# Altium footprint library Wurth_Elektronik_Electromechanic_Wire_to_Board_Connectors_rev16a.PCBLIB: 662 footprints (part 32 of 42)
Each footprint in its own frame and in the unit in brackets; x right, y up, seen from the top. Pads: shape width x height; smd on the part's side, far side on the other; paste and mask are expansions set on the pad; w line width, h text height; cw(c..) or ccw(c..) is an arc to the next point about the centre after c.
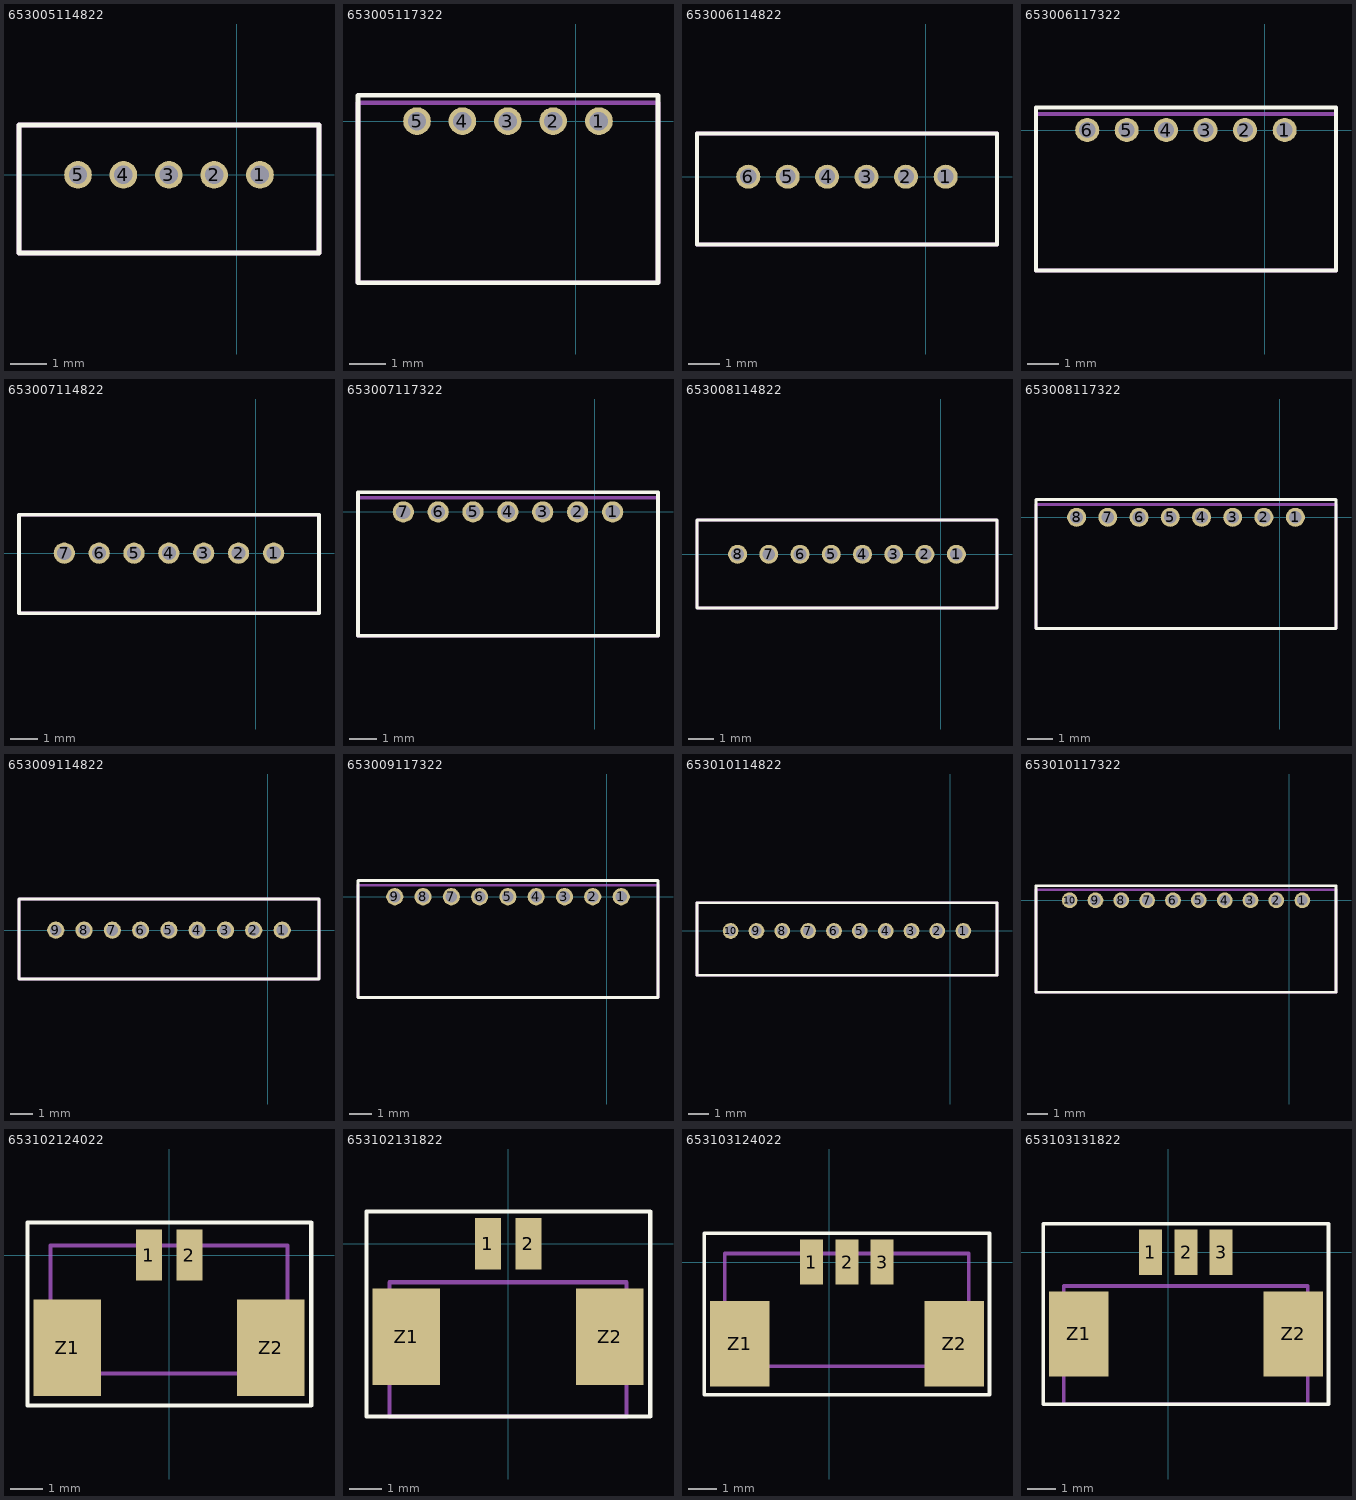
[diagram p31: the footprints below, top view; thin cyan lines are the x and y axes]

## 653005114822 [mil]
pads (5):
  round 30 hole 20: 1(25,0) 2(-24.61,0) 3(-73.82,0) 4(-123.03,0) 5(-172.24,0)
Top Overlay:
  lines w5: -236.22,-84.65 89,-84.65 89,54 -236.22,54 -236.22,-84.65
Mechanical 2:
  text ">NAME" at 153,-4.92 h77.5
Mechanical 4:
  text ">VALUE" at 153,-63.98 h77.5
Mechanical 16:
  lines w5: -236.22,-84.65 89,-84.65 89,54 -236.22,54 -236.22,-84.65
  text "1" at 13,-12.3 h49.6
  text "5" at -184.55,-12.3 h49.6

## 653005117322 [mil]
pads (5):
  round 30 hole 20: 1(25,0) 2(-24.61,0) 3(-73.82,0) 4(-123.03,0) 5(-172.24,0)
Top Overlay:
  lines w5: -236.22,-175.2 89,-175.2 89,28 -236.22,28 -236.22,-175.2
Mechanical 2:
  text ">NAME" at 153,-4.92 h77.5
Mechanical 4:
  text ">VALUE" at 153,-63.98 h77.5
Mechanical 16:
  lines w5: -236.22,-175.2 89,-175.2 89,20 -236.22,20 -236.22,-175.2
  text "1" at 13,-12.3 h49.6
  text "5" at -184.55,-12.3 h49.6

## 653006114822 [mil]
pads (6):
  round 30 hole 20: 1(25,0) 2(-24.61,0) 3(-73.82,0) 4(-123.03,0) 5(-172.24,0) 6(-221.46,0)
Top Overlay:
  lines w5: -285.43,-84.65 89,-84.65 89,54 -285.43,54 -285.43,-84.65
Mechanical 2:
  text ">NAME" at 153,-4.92 h77.5
Mechanical 4:
  text ">VALUE" at 153,-63.98 h77.5
Mechanical 16:
  lines w5: -285.43,-84.65 89,-84.65 89,54 -285.43,54 -285.43,-84.65
  text "1" at 13,-12.3 h49.6
  text "6" at -233.76,-12.3 h49.6

## 653006117322 [mil]
pads (6):
  round 30 hole 20: 1(25,0) 2(-24.61,0) 3(-73.82,0) 4(-123.03,0) 5(-172.24,0) 6(-221.46,0)
Top Overlay:
  lines w5: -285.43,-175.2 89,-175.2 89,28 -285.43,28 -285.43,-175.2
Mechanical 2:
  text ">NAME" at 153,-4.92 h77.5
Mechanical 4:
  text ">VALUE" at 153,-63.98 h77.5
Mechanical 16:
  lines w5: -285.43,-175.2 89,-175.2 89,20 -285.43,20 -285.43,-175.2
  text "1" at 13,-12.3 h49.6
  text "6" at -233.76,-12.3 h49.6

## 653007114822 [mil]
pads (7):
  round 30 hole 20: 1(25,0) 2(-24.61,0) 3(-73.82,0) 4(-123.03,0) 5(-172.24,0) 6(-221.46,0) 7(-270.67,0)
Top Overlay:
  lines w5: -334.65,-84.65 89,-84.65 89,54 -334.65,54 -334.65,-84.65
Mechanical 2:
  text ">NAME" at 153,-4.92 h77.5
Mechanical 4:
  text ">VALUE" at 153,-63.98 h77.5
Mechanical 16:
  lines w5: -334.65,-84.65 89,-84.65 89,54 -334.65,54 -334.65,-84.65
  text "1" at 13,-12.3 h49.6
  text "7" at -282.97,-12.3 h49.6

## 653007117322 [mil]
pads (7):
  round 30 hole 20: 1(25,0) 2(-24.61,0) 3(-73.82,0) 4(-123.03,0) 5(-172.24,0) 6(-221.46,0) 7(-270.67,0)
Top Overlay:
  lines w5: -334.65,-175.2 89,-175.2 89,28 -334.65,28 -334.65,-175.2
Mechanical 2:
  text ">NAME" at 153,-4.92 h77.5
Mechanical 4:
  text ">VALUE" at 153,-63.98 h77.5
Mechanical 16:
  lines w5: -334.65,-175.2 89,-175.2 89,20 -334.65,20 -334.65,-175.2
  text "1" at 13,-12.3 h49.6
  text "7" at -282.97,-12.3 h49.6

## 653008114822 [mil]
pads (8):
  round 30 hole 20: 1(25,0) 2(-24.61,0) 3(-73.82,0) 4(-123.03,0) 5(-172.24,0) 6(-221.46,0) 7(-270.67,0) 8(-319.88,0)
Top Overlay:
  lines w5: -383.86,-84.65 89,-84.65 89,54 -383.86,54 -383.86,-84.65
Mechanical 2:
  text ">NAME" at 153,-4.92 h77.5
Mechanical 4:
  text ">VALUE" at 153,-63.98 h77.5
Mechanical 16:
  lines w5: -383.86,-84.65 89,-84.65 89,54 -383.86,54 -383.86,-84.65
  text "1" at 13,-12.3 h49.6
  text "8" at -332.19,-12.3 h49.6

## 653008117322 [mil]
pads (8):
  round 30 hole 20: 1(25,0) 2(-24.61,0) 3(-73.82,0) 4(-123.03,0) 5(-172.24,0) 6(-221.46,0) 7(-270.67,0) 8(-319.88,0)
Top Overlay:
  lines w5: -383.86,-175.2 89,-175.2 89,28 -383.86,28 -383.86,-175.2
Mechanical 2:
  text ">NAME" at 153,-4.92 h77.5
Mechanical 4:
  text ">VALUE" at 153,-63.98 h77.5
Mechanical 16:
  lines w5: -383.86,-175.2 89,-175.2 89,20 -383.86,20 -383.86,-175.2
  text "1" at 13,-12.3 h49.6
  text "8" at -332.19,-12.3 h49.6

## 653009114822 [mil]
pads (9):
  round 30 hole 20: 1(25,0) 2(-24.61,0) 3(-73.82,0) 4(-123.03,0) 5(-172.24,0) 6(-221.46,0) 7(-270.67,0) 8(-319.88,0) 9(-369.09,0)
Top Overlay:
  lines w5: -433.07,-84.65 89,-84.65 89,54 -433.07,54 -433.07,-84.65
Mechanical 2:
  text ">NAME" at 153,-4.92 h77.5
Mechanical 4:
  text ">VALUE" at 153,-63.98 h77.5
Mechanical 16:
  lines w5: -433.07,-84.65 89,-84.65 89,54 -433.07,54 -433.07,-84.65
  text "1" at 13,-12.3 h49.6
  text "9" at -381.4,-12.3 h49.6

## 653009117322 [mil]
pads (9):
  round 30 hole 20: 1(25,0) 2(-24.61,0) 3(-73.82,0) 4(-123.03,0) 5(-172.24,0) 6(-221.46,0) 7(-270.67,0) 8(-319.88,0) 9(-369.09,0)
Top Overlay:
  lines w5: -433.07,-175.2 89,-175.2 89,28 -433.07,28 -433.07,-175.2
Mechanical 2:
  text ">NAME" at 153,-4.92 h77.5
Mechanical 4:
  text ">VALUE" at 153,-63.98 h77.5
Mechanical 16:
  lines w5: -433.07,-175.2 89,-175.2 89,20 -433.07,20 -433.07,-175.2
  text "1" at 13,-12.3 h49.6
  text "9" at -381.4,-12.3 h49.6

## 653010114822 [mil]
pads (10):
  round 30 hole 20: 1(25,0) 2(-24.61,0) 3(-73.82,0) 4(-123.03,0) 5(-172.24,0) 6(-221.46,0) 7(-270.67,0) 8(-319.88,0) 9(-369.09,0) 10(-418.31,0)
Top Overlay:
  lines w5: -482.28,-84.65 89,-84.65 89,54 -482.28,54 -482.28,-84.65
Mechanical 2:
  text ">NAME" at 153,-4.92 h77.5
Mechanical 4:
  text ">VALUE" at 153,-63.98 h77.5
Mechanical 16:
  lines w5: -482.28,-84.65 89,-84.65 89,54 -482.28,54 -482.28,-84.65
  text "1" at 13,-12.3 h49.6
  text "10" at -442.91,-12.3 h49.6

## 653010117322 [mil]
pads (10):
  round 30 hole 20: 1(25,0) 2(-24.61,0) 3(-73.82,0) 4(-123.03,0) 5(-172.24,0) 6(-221.46,0) 7(-270.67,0) 8(-319.88,0) 9(-369.09,0) 10(-418.31,0)
Top Overlay:
  lines w5: -482.28,-175.2 89,-175.2 89,28 -482.28,28 -482.28,-175.2
Mechanical 2:
  text ">NAME" at 153,-4.92 h77.5
Mechanical 4:
  text ">VALUE" at 153,-63.98 h77.5
Mechanical 16:
  lines w5: -482.28,-175.2 89,-175.2 89,20 -482.28,20 -482.28,-175.2
  text "1" at 13,-12.3 h49.6
  text "10" at -455.22,-12.3 h49.6

## 653102124022 [mil]
pads (4):
  rect 32x63 smd: 1(-24.61,0) 2(25,0)
  rect 83x119 smd: Z1(-125,-114.17) Z2(125,-114.17)
Top Overlay:
  lines w5: -174.21,-185.04 175,-185.04 175,40 -174.21,40 -174.21,-185.04
Mechanical 2:
  text ">NAME" at -120.47,54 h77.5
Mechanical 4:
  text ">VALUE" at -144.98,-251.48 h77.5
Mechanical 16:
  lines w5: -145.67,-145.67 146,-145.67 146,12 -145.67,12 -145.67,-145.67
  text "1" at -50,-50 h77.5

## 653102131822 [mil]
pads (4):
  rect 32x63 smd: 1(-24.61,0) 2(25,0)
  rect 83x119 smd: Z1(-125,-114.17) Z2(125,-114.17)
Top Overlay:
  lines w5: -174.21,-212.6 175,-212.6 175,40 -174.21,40 -174.21,-212.6
Mechanical 2:
  text ">NAME" at -120.47,54 h77.5
Mechanical 4:
  text ">VALUE" at -119.98,-276.48 h77.5
Mechanical 16:
  lines w5: -145.67,-212.6 146,-212.6 146,-47.24 -145.67,-47.24 -145.67,-212.6
  text "1" at -50,-25 h77.5

## 653103124022 [mil]
pads (5):
  rect 32x63 smd: 1(-24.61,0) 2(25,0) 3(74,0)
  rect 83x119 smd: Z1(-125,-114.17) Z2(175,-114.17)
Top Overlay:
  lines w5: -174.21,-185.04 224,-185.04 224,40 -174.21,40 -174.21,-185.04
Mechanical 2:
  text ">NAME" at -95.47,54 h77.5
Mechanical 4:
  text ">VALUE" at -94.98,-251.48 h77.5
Mechanical 16:
  lines w5: -145.67,-145.67 195,-145.67 195,12 -145.67,12 -145.67,-145.67
  text "1" at -50,-50 h77.5

## 653103131822 [mil]
pads (5):
  rect 32x63 smd: 1(-24.61,0) 2(25,0) 3(74,0)
  rect 83x119 smd: Z1(-125,-114.17) Z2(175,-114.17)
Top Overlay:
  lines w5: -174.21,-212.6 224,-212.6 224,40 -174.21,40 -174.21,-212.6
Mechanical 2:
  text ">NAME" at -95.47,54 h77.5
Mechanical 4:
  text ">VALUE" at -94.98,-276.48 h77.5
Mechanical 16:
  lines w5: -145.67,-212.6 195,-212.6 195,-47.24 -145.67,-47.24 -145.67,-212.6
  text "1" at -50,-25 h77.5